# Altium schematic symbol library jlcpcb_2025_04_capacitors_extended_0805.schlib: 3281 symbols (part 17 of 18) (continued)
## TCC0805X7R105K500DTS
designator C?  Capacitance: 1uF  (hidden comment: *)
Capacitor, Ceramic (MLCC), 1uF, ±10%, 50V, X7R, ±10%, SMD 0805; Manufacturer: CCTC; Manufacturer Part Number: TCC0805X7R105K500DTS; Package Size: 0805; JLCPCB Basic Part: No; JLCPCB Part Number: C344178; Supplier 1: LCSC; Category: Capacitors - MLCC; Supplier Part Number 1: C344178; Tolerance: ±10%; Voltage Rating: 50V; Temperature Coefficient: X7R; RoHS: Yes; ComponentLink1Description: Datasheet; ComponentLink1URL: https://wmsc.lcsc.com/wmsc/upload/file/pdf/v2/lcsc/2304140030_CCTC-TCC0805X7R105K500DTS_C344178.pdf; ComponentLink2Description: JLCPCB Part URL; ComponentLink2URL: https://jlcpcb.com/partdetail/C344178; ComponentLink3Description: LCSC Part URL; ComponentLink3URL: https://lcsc.com/product-detail/Multilayer-Ceramic-Capacitors-MLCC---SMD-SMT_CCTC-CCTC-TCC0805X7R105K500DTS_C344178.html
footprint CAP-0805 (0805 (2012M) Capacitor)
pins: 1, 2

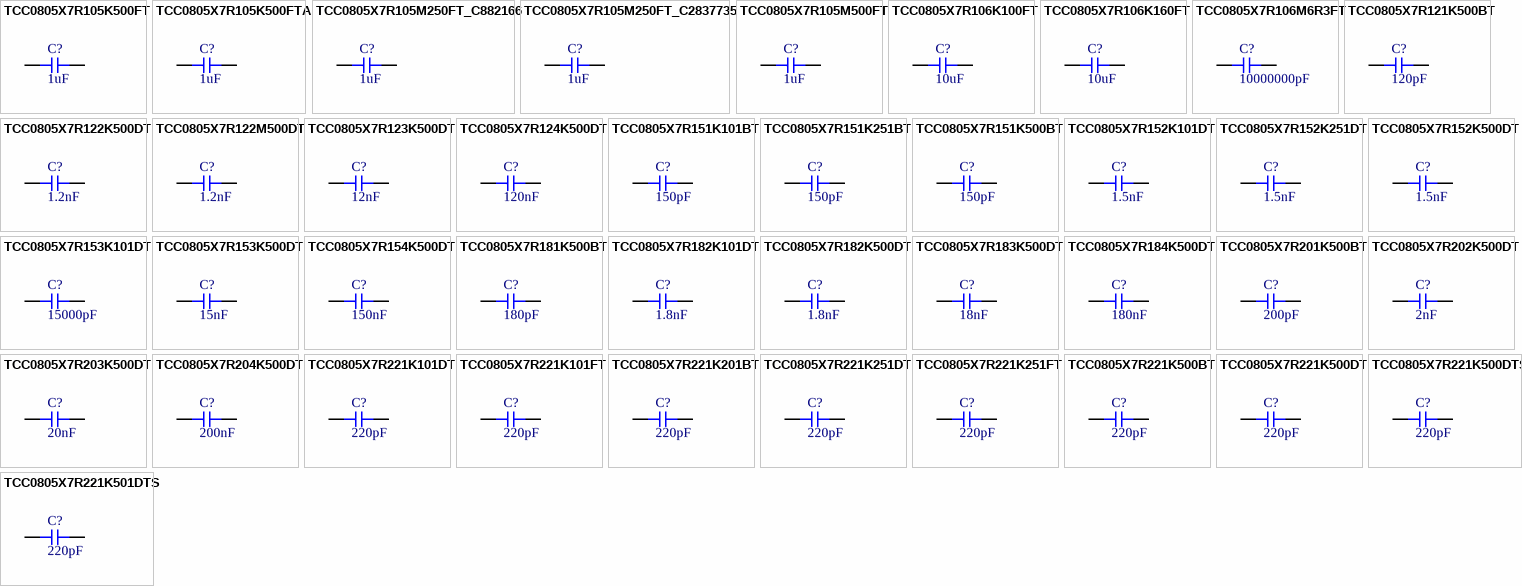
[diagram p77: symbols TCC0805X7R105K500FT to TCC0805X7R221K501DTS]

## TCC0805X7R105K500FT
designator C?  Capacitance: 1uF  (hidden comment: *)
Capacitor, Ceramic (MLCC), 1uF, ±10%, 50V, X7R, ±10%, SMD 0805; Manufacturer: CCTC; Manufacturer Part Number: TCC0805X7R105K500FT; Package Size: 0805; JLCPCB Basic Part: No; JLCPCB Part Number: C376927; Supplier 1: LCSC; Category: Capacitors - MLCC; Supplier Part Number 1: C376927; Tolerance: ±10%; Voltage Rating: 50V; Temperature Coefficient: X7R; RoHS: Yes; ComponentLink1Description: Datasheet; ComponentLink1URL: https://wmsc.lcsc.com/wmsc/upload/file/pdf/v2/lcsc/2304140030_CCTC-TCC0805X7R105K500FT_C376927.pdf; ComponentLink2Description: JLCPCB Part URL; ComponentLink2URL: https://jlcpcb.com/partdetail/C376927; ComponentLink3Description: LCSC Part URL; ComponentLink3URL: https://lcsc.com/product-detail/Multilayer-Ceramic-Capacitors-MLCC---SMD-SMT_CCTC-CCTC-TCC0805X7R105K500FT_C376927.html
footprint CAP-0805 (0805 (2012M) Capacitor)
pins: 1, 2

## TCC0805X7R105K500FTA
designator C?  Capacitance: 1uF  (hidden comment: *)
Capacitor, Ceramic (MLCC), 1uF, ±10%, 50V, X7R, ±10%, SMD 0805; Manufacturer: CCTC; Manufacturer Part Number: TCC0805X7R105K500FTA; Package Size: 0805; JLCPCB Basic Part: No; JLCPCB Part Number: C282737; Supplier 1: LCSC; Category: Capacitors - MLCC; Supplier Part Number 1: C282737; Tolerance: ±10%; Voltage Rating: 50V; Temperature Coefficient: X7R; RoHS: Yes; ComponentLink1Description: Datasheet; ComponentLink1URL: https://wmsc.lcsc.com/wmsc/upload/file/pdf/v2/lcsc/2304140030_CCTC-TCC0805X7R105K500FTA_C282737.pdf; ComponentLink2Description: JLCPCB Part URL; ComponentLink2URL: https://jlcpcb.com/partdetail/C282737; ComponentLink3Description: LCSC Part URL; ComponentLink3URL: https://lcsc.com/product-detail/Multilayer-Ceramic-Capacitors-MLCC---SMD-SMT_CCTC-CCTC-TCC0805X7R105K500FTA_C282737.html
footprint CAP-0805 (0805 (2012M) Capacitor)
pins: 1, 2

## TCC0805X7R105M250FT_C882166
designator C?  Capacitance: 1uF  (hidden comment: *)
Capacitor, Ceramic (MLCC), 1uF, ±20%, 25V, X7R, ±20%, SMD 0805; Manufacturer: CCTC; Manufacturer Part Number: TCC0805X7R105M250FT; Package Size: 0805; JLCPCB Basic Part: No; JLCPCB Part Number: C882166; Supplier 1: LCSC; Category: Capacitors - MLCC; Supplier Part Number 1: C882166; Tolerance: ±20%; Voltage Rating: 25V; Temperature Coefficient: X7R; RoHS: Yes; ComponentLink1Description: Datasheet; ComponentLink1URL: https://wmsc.lcsc.com/wmsc/upload/file/pdf/v2/lcsc/2304140030_CCTC-TCC0805X7R105M250FT_C882166.pdf; ComponentLink2Description: JLCPCB Part URL; ComponentLink2URL: https://jlcpcb.com/partdetail/C882166; ComponentLink3Description: LCSC Part URL; ComponentLink3URL: https://lcsc.com/product-detail/Multilayer-Ceramic-Capacitors-MLCC---SMD-SMT_CCTC-CCTC-TCC0805X7R105M250FT_C882166.html
footprint CAP-0805 (0805 (2012M) Capacitor)
pins: 1, 2

## TCC0805X7R105M250FT_C2837735
designator C?  Capacitance: 1uF  (hidden comment: *)
Capacitor, Ceramic (MLCC), 1uF, ±20%, 25V, X7R, ±20%, SMD 0805; Manufacturer: CCTC; Manufacturer Part Number: TCC0805X7R105M250FT; Package Size: 0805; JLCPCB Basic Part: No; JLCPCB Part Number: C2837735; Supplier 1: LCSC; Category: Capacitors - MLCC; Supplier Part Number 1: C2837735; Tolerance: ±20%; Voltage Rating: 25V; Temperature Coefficient: X7R; RoHS: Yes; ComponentLink1Description: Datasheet; ComponentLink1URL: https://wmsc.lcsc.com/wmsc/upload/file/pdf/v2/lcsc/2106021033_CCTC-TCC0805X7R105M250FT_C2837735.pdf; ComponentLink2Description: JLCPCB Part URL; ComponentLink2URL: https://jlcpcb.com/partdetail/C2837735; ComponentLink3Description: LCSC Part URL; ComponentLink3URL: https://lcsc.com/product-detail/Multilayer-Ceramic-Capacitors-MLCC---SMD-SMT_CCTC-CCTC-TCC0805X7R105M250FT_C2837735.html
footprint CAP-0805 (0805 (2012M) Capacitor)
pins: 1, 2

## TCC0805X7R105M500FT
designator C?  Capacitance: 1uF  (hidden comment: *)
Capacitor, Ceramic (MLCC), 1uF, ±20%, 50V, X7R, ±20%, SMD 0805; Manufacturer: CCTC; Manufacturer Part Number: TCC0805X7R105M500FT; Package Size: 0805; JLCPCB Basic Part: No; JLCPCB Part Number: C376929; Supplier 1: LCSC; Category: Capacitors - MLCC; Supplier Part Number 1: C376929; Tolerance: ±20%; Voltage Rating: 50V; Temperature Coefficient: X7R; RoHS: Yes; ComponentLink1Description: Datasheet; ComponentLink1URL: https://wmsc.lcsc.com/wmsc/upload/file/pdf/v2/lcsc/2304140030_CCTC-TCC0805X7R105M500FT_C376929.pdf; ComponentLink2Description: JLCPCB Part URL; ComponentLink2URL: https://jlcpcb.com/partdetail/C376929; ComponentLink3Description: LCSC Part URL; ComponentLink3URL: https://lcsc.com/product-detail/Multilayer-Ceramic-Capacitors-MLCC---SMD-SMT_CCTC-CCTC-TCC0805X7R105M500FT_C376929.html
footprint CAP-0805 (0805 (2012M) Capacitor)
pins: 1, 2

## TCC0805X7R106K100FT
designator C?  Capacitance: 10uF  (hidden comment: *)
Capacitor, Ceramic (MLCC), 10uF, ±10%, 10V, X7R, ±10%, SMD 0805; Manufacturer: CCTC; Manufacturer Part Number: TCC0805X7R106K100FT; Package Size: 0805; JLCPCB Basic Part: No; JLCPCB Part Number: C380346; Supplier 1: LCSC; Category: Capacitors - MLCC; Supplier Part Number 1: C380346; Tolerance: ±10%; Voltage Rating: 10V; Temperature Coefficient: X7R; RoHS: Yes; ComponentLink1Description: Datasheet; ComponentLink1URL: https://wmsc.lcsc.com/wmsc/upload/file/pdf/v2/lcsc/2304140030_CCTC-TCC0805X7R106K100FT_C380346.pdf; ComponentLink2Description: JLCPCB Part URL; ComponentLink2URL: https://jlcpcb.com/partdetail/C380346; ComponentLink3Description: LCSC Part URL; ComponentLink3URL: https://lcsc.com/product-detail/Multilayer-Ceramic-Capacitors-MLCC---SMD-SMT_CCTC-CCTC-TCC0805X7R106K100FT_C380346.html
footprint CAP-0805 (0805 (2012M) Capacitor)
pins: 1, 2

## TCC0805X7R106K160FT
designator C?  Capacitance: 10uF  (hidden comment: *)
Capacitor, Ceramic (MLCC), 10uF, ±10%, 16V, X7R, ±10%, SMD 0805; Manufacturer: CCTC; Manufacturer Part Number: TCC0805X7R106K160FT; Package Size: 0805; JLCPCB Basic Part: No; JLCPCB Part Number: C380347; Supplier 1: LCSC; Category: Capacitors - MLCC; Supplier Part Number 1: C380347; Tolerance: ±10%; Voltage Rating: 16V; Temperature Coefficient: X7R; RoHS: Yes; ComponentLink1Description: Datasheet; ComponentLink1URL: https://wmsc.lcsc.com/wmsc/upload/file/pdf/v2/lcsc/2304140030_CCTC-TCC0805X7R106K160FT_C380347.pdf; ComponentLink2Description: JLCPCB Part URL; ComponentLink2URL: https://jlcpcb.com/partdetail/C380347; ComponentLink3Description: LCSC Part URL; ComponentLink3URL: https://lcsc.com/product-detail/Multilayer-Ceramic-Capacitors-MLCC---SMD-SMT_CCTC-CCTC-TCC0805X7R106K160FT_C380347.html
footprint CAP-0805 (0805 (2012M) Capacitor)
pins: 1, 2

## TCC0805X7R106M6R3FT
designator C?  Capacitance: 10000000pF  (hidden comment: *)
Capacitor, Ceramic (MLCC), 10000000pF, ±20%, 6.3V, X7R, ±20%, SMD 0805; Manufacturer: CCTC; Manufacturer Part Number: TCC0805X7R106M6R3FT; Package Size: 0805; JLCPCB Basic Part: No; JLCPCB Part Number: C880610; Supplier 1: LCSC; Category: Capacitors - MLCC; Supplier Part Number 1: C880610; Tolerance: ±20%; Voltage Rating: 6.3V; Temperature Coefficient: X7R; RoHS: Yes; ComponentLink1Description: Datasheet; ComponentLink1URL: https://wmsc.lcsc.com/wmsc/upload/file/pdf/v2/lcsc/2304140030_CCTC-TCC0805X7R106M6R3FT_C880610.pdf; ComponentLink2Description: JLCPCB Part URL; ComponentLink2URL: https://jlcpcb.com/partdetail/C880610; ComponentLink3Description: LCSC Part URL; ComponentLink3URL: https://lcsc.com/product-detail/Multilayer-Ceramic-Capacitors-MLCC---SMD-SMT_CCTC-CCTC-TCC0805X7R106M6R3FT_C880610.html
footprint CAP-0805 (0805 (2012M) Capacitor)
pins: 1, 2

## TCC0805X7R121K500BT
designator C?  Capacitance: 120pF  (hidden comment: *)
Capacitor, Ceramic (MLCC), 120pF, ±10%, 50V, X7R, ±10%, SMD 0805; Manufacturer: CCTC; Manufacturer Part Number: TCC0805X7R121K500BT; Package Size: 0805; JLCPCB Basic Part: No; JLCPCB Part Number: C376930; Supplier 1: LCSC; Category: Capacitors - MLCC; Supplier Part Number 1: C376930; Tolerance: ±10%; Voltage Rating: 50V; Temperature Coefficient: X7R; RoHS: Yes; ComponentLink1Description: Datasheet; ComponentLink1URL: https://wmsc.lcsc.com/wmsc/upload/file/pdf/v2/lcsc/2304140030_CCTC-TCC0805X7R121K500BT_C376930.pdf; ComponentLink2Description: JLCPCB Part URL; ComponentLink2URL: https://jlcpcb.com/partdetail/C376930; ComponentLink3Description: LCSC Part URL; ComponentLink3URL: https://lcsc.com/product-detail/Multilayer-Ceramic-Capacitors-MLCC---SMD-SMT_CCTC-CCTC-TCC0805X7R121K500BT_C376930.html
footprint CAP-0805 (0805 (2012M) Capacitor)
pins: 1, 2

## TCC0805X7R122K500DT
designator C?  Capacitance: 1.2nF  (hidden comment: *)
Capacitor, Ceramic (MLCC), 1.2nF, ±10%, 50V, X7R, ±10%, SMD 0805; Manufacturer: CCTC; Manufacturer Part Number: TCC0805X7R122K500DT; Package Size: 0805; JLCPCB Basic Part: No; JLCPCB Part Number: C282740; Supplier 1: LCSC; Category: Capacitors - MLCC; Supplier Part Number 1: C282740; Tolerance: ±10%; Voltage Rating: 50V; Temperature Coefficient: X7R; RoHS: Yes; ComponentLink1Description: Datasheet; ComponentLink1URL: https://wmsc.lcsc.com/wmsc/upload/file/pdf/v2/lcsc/2304140030_CCTC-TCC0805X7R122K500DT_C282740.pdf; ComponentLink2Description: JLCPCB Part URL; ComponentLink2URL: https://jlcpcb.com/partdetail/C282740; ComponentLink3Description: LCSC Part URL; ComponentLink3URL: https://lcsc.com/product-detail/Multilayer-Ceramic-Capacitors-MLCC---SMD-SMT_CCTC-CCTC-TCC0805X7R122K500DT_C282740.html
footprint CAP-0805 (0805 (2012M) Capacitor)
pins: 1, 2

## TCC0805X7R122M500DT
designator C?  Capacitance: 1.2nF  (hidden comment: *)
Capacitor, Ceramic (MLCC), 1.2nF, 50V, SMD 0805; Manufacturer: CCTC; Manufacturer Part Number: TCC0805X7R122M500DT; Package Size: 0805; JLCPCB Basic Part: No; JLCPCB Part Number: C2760545; Supplier 1: LCSC; Category: Capacitors - MLCC; Supplier Part Number 1: C2760545; Voltage Rating: 50V; RoHS: Yes; ComponentLink1Description: Datasheet; ComponentLink1URL: https://wmsc.lcsc.com/wmsc/upload/file/pdf/v2/lcsc/2304140030_CCTC-TCC0805X7R122M500DT_C2760545.pdf; ComponentLink2Description: JLCPCB Part URL; ComponentLink2URL: https://jlcpcb.com/partdetail/C2760545; ComponentLink3Description: LCSC Part URL; ComponentLink3URL: https://lcsc.com/product-detail/Multilayer-Ceramic-Capacitors-MLCC---SMD-SMT_CCTC-CCTC-TCC0805X7R122M500DT_C2760545.html
footprint CAP-0805 (0805 (2012M) Capacitor)
pins: 1, 2

## TCC0805X7R123K500DT
designator C?  Capacitance: 12nF  (hidden comment: *)
Capacitor, Ceramic (MLCC), 12nF, ±10%, 50V, X7R, ±10%, SMD 0805; Manufacturer: CCTC; Manufacturer Part Number: TCC0805X7R123K500DT; Package Size: 0805; JLCPCB Basic Part: No; JLCPCB Part Number: C309047; Supplier 1: LCSC; Category: Capacitors - MLCC; Supplier Part Number 1: C309047; Tolerance: ±10%; Voltage Rating: 50V; Temperature Coefficient: X7R; RoHS: Yes; ComponentLink1Description: Datasheet; ComponentLink1URL: https://wmsc.lcsc.com/wmsc/upload/file/pdf/v2/lcsc/2304140030_CCTC-TCC0805X7R123K500DT_C309047.pdf; ComponentLink2Description: JLCPCB Part URL; ComponentLink2URL: https://jlcpcb.com/partdetail/C309047; ComponentLink3Description: LCSC Part URL; ComponentLink3URL: https://lcsc.com/product-detail/Multilayer-Ceramic-Capacitors-MLCC---SMD-SMT_CCTC-CCTC-TCC0805X7R123K500DT_C309047.html
footprint CAP-0805 (0805 (2012M) Capacitor)
pins: 1, 2

## TCC0805X7R124K500DT
designator C?  Capacitance: 120nF  (hidden comment: *)
Capacitor, Ceramic (MLCC), 120nF, ±10%, 50V, X7R, ±10%, SMD 0805; Manufacturer: CCTC; Manufacturer Part Number: TCC0805X7R124K500DT; Package Size: 0805; JLCPCB Basic Part: No; JLCPCB Part Number: C376931; Supplier 1: LCSC; Category: Capacitors - MLCC; Supplier Part Number 1: C376931; Tolerance: ±10%; Voltage Rating: 50V; Temperature Coefficient: X7R; RoHS: Yes; ComponentLink1Description: Datasheet; ComponentLink1URL: https://wmsc.lcsc.com/wmsc/upload/file/pdf/v2/lcsc/2304140030_CCTC-TCC0805X7R124K500DT_C376931.pdf; ComponentLink2Description: JLCPCB Part URL; ComponentLink2URL: https://jlcpcb.com/partdetail/C376931; ComponentLink3Description: LCSC Part URL; ComponentLink3URL: https://lcsc.com/product-detail/Multilayer-Ceramic-Capacitors-MLCC---SMD-SMT_CCTC-CCTC-TCC0805X7R124K500DT_C376931.html
footprint CAP-0805 (0805 (2012M) Capacitor)
pins: 1, 2

## TCC0805X7R151K101BT
designator C?  Capacitance: 150pF  (hidden comment: *)
Capacitor, Ceramic (MLCC), 150pF, ±10%, 100V, X7R, ±10%, SMD 0805; Manufacturer: CCTC; Manufacturer Part Number: TCC0805X7R151K101BT; Package Size: 0805; JLCPCB Basic Part: No; JLCPCB Part Number: C282741; Supplier 1: LCSC; Category: Capacitors - MLCC; Supplier Part Number 1: C282741; Tolerance: ±10%; Voltage Rating: 100V; Temperature Coefficient: X7R; RoHS: Yes; ComponentLink1Description: Datasheet; ComponentLink1URL: https://wmsc.lcsc.com/wmsc/upload/file/pdf/v2/lcsc/2304140030_CCTC-TCC0805X7R151K101BT_C282741.pdf; ComponentLink2Description: JLCPCB Part URL; ComponentLink2URL: https://jlcpcb.com/partdetail/C282741; ComponentLink3Description: LCSC Part URL; ComponentLink3URL: https://lcsc.com/product-detail/Multilayer-Ceramic-Capacitors-MLCC---SMD-SMT_CCTC-CCTC-TCC0805X7R151K101BT_C282741.html
footprint CAP-0805 (0805 (2012M) Capacitor)
pins: 1, 2

## TCC0805X7R151K251BT
designator C?  Capacitance: 150pF  (hidden comment: *)
Capacitor, Ceramic (MLCC), 150pF, ±10%, 250V, X7R, ±10%, SMD 0805; Manufacturer: CCTC; Manufacturer Part Number: TCC0805X7R151K251BT; Package Size: 0805; JLCPCB Basic Part: No; JLCPCB Part Number: C282742; Supplier 1: LCSC; Category: Capacitors - MLCC; Supplier Part Number 1: C282742; Tolerance: ±10%; Voltage Rating: 250V; Temperature Coefficient: X7R; RoHS: Yes; ComponentLink1Description: Datasheet; ComponentLink1URL: https://wmsc.lcsc.com/wmsc/upload/file/pdf/v2/lcsc/2304140030_CCTC-TCC0805X7R151K251BT_C282742.pdf; ComponentLink2Description: JLCPCB Part URL; ComponentLink2URL: https://jlcpcb.com/partdetail/C282742; ComponentLink3Description: LCSC Part URL; ComponentLink3URL: https://lcsc.com/product-detail/Multilayer-Ceramic-Capacitors-MLCC---SMD-SMT_CCTC-CCTC-TCC0805X7R151K251BT_C282742.html
footprint CAP-0805 (0805 (2012M) Capacitor)
pins: 1, 2

## TCC0805X7R151K500BT
designator C?  Capacitance: 150pF  (hidden comment: *)
Capacitor, Ceramic (MLCC), 150pF, ±10%, 50V, X7R, ±10%, SMD 0805; Manufacturer: CCTC; Manufacturer Part Number: TCC0805X7R151K500BT; Package Size: 0805; JLCPCB Basic Part: No; JLCPCB Part Number: C282743; Supplier 1: LCSC; Category: Capacitors - MLCC; Supplier Part Number 1: C282743; Tolerance: ±10%; Voltage Rating: 50V; Temperature Coefficient: X7R; RoHS: Yes; ComponentLink1Description: Datasheet; ComponentLink1URL: https://wmsc.lcsc.com/wmsc/upload/file/pdf/v2/lcsc/2304140030_CCTC-TCC0805X7R151K500BT_C282743.pdf; ComponentLink2Description: JLCPCB Part URL; ComponentLink2URL: https://jlcpcb.com/partdetail/C282743; ComponentLink3Description: LCSC Part URL; ComponentLink3URL: https://lcsc.com/product-detail/Multilayer-Ceramic-Capacitors-MLCC---SMD-SMT_CCTC-CCTC-TCC0805X7R151K500BT_C282743.html
footprint CAP-0805 (0805 (2012M) Capacitor)
pins: 1, 2

## TCC0805X7R152K101DT
designator C?  Capacitance: 1.5nF  (hidden comment: *)
Capacitor, Ceramic (MLCC), 1.5nF, ±10%, 100V, X7R, ±10%, SMD 0805; Manufacturer: CCTC; Manufacturer Part Number: TCC0805X7R152K101DT; Package Size: 0805; JLCPCB Basic Part: No; JLCPCB Part Number: C376932; Supplier 1: LCSC; Category: Capacitors - MLCC; Supplier Part Number 1: C376932; Tolerance: ±10%; Voltage Rating: 100V; Temperature Coefficient: X7R; RoHS: Yes; ComponentLink1Description: Datasheet; ComponentLink1URL: https://wmsc.lcsc.com/wmsc/upload/file/pdf/v2/lcsc/2304140030_CCTC-TCC0805X7R152K101DT_C376932.pdf; ComponentLink2Description: JLCPCB Part URL; ComponentLink2URL: https://jlcpcb.com/partdetail/C376932; ComponentLink3Description: LCSC Part URL; ComponentLink3URL: https://lcsc.com/product-detail/Multilayer-Ceramic-Capacitors-MLCC---SMD-SMT_CCTC-CCTC-TCC0805X7R152K101DT_C376932.html
footprint CAP-0805 (0805 (2012M) Capacitor)
pins: 1, 2

## TCC0805X7R152K251DT
designator C?  Capacitance: 1.5nF  (hidden comment: *)
Capacitor, Ceramic (MLCC), 1.5nF, ±10%, 250V, X7R, ±10%, SMD 0805; Manufacturer: CCTC; Manufacturer Part Number: TCC0805X7R152K251DT; Package Size: 0805; JLCPCB Basic Part: No; JLCPCB Part Number: C282744; Supplier 1: LCSC; Category: Capacitors - MLCC; Supplier Part Number 1: C282744; Tolerance: ±10%; Voltage Rating: 250V; Temperature Coefficient: X7R; RoHS: Yes; ComponentLink1Description: Datasheet; ComponentLink1URL: https://wmsc.lcsc.com/wmsc/upload/file/pdf/v2/lcsc/2304140030_CCTC-TCC0805X7R152K251DT_C282744.pdf; ComponentLink2Description: JLCPCB Part URL; ComponentLink2URL: https://jlcpcb.com/partdetail/C282744; ComponentLink3Description: LCSC Part URL; ComponentLink3URL: https://lcsc.com/product-detail/Multilayer-Ceramic-Capacitors-MLCC---SMD-SMT_CCTC-CCTC-TCC0805X7R152K251DT_C282744.html
footprint CAP-0805 (0805 (2012M) Capacitor)
pins: 1, 2

## TCC0805X7R152K500DT
designator C?  Capacitance: 1.5nF  (hidden comment: *)
Capacitor, Ceramic (MLCC), 1.5nF, ±10%, 50V, X7R, ±10%, SMD 0805; Manufacturer: CCTC; Manufacturer Part Number: TCC0805X7R152K500DT; Package Size: 0805; JLCPCB Basic Part: No; JLCPCB Part Number: C282745; Supplier 1: LCSC; Category: Capacitors - MLCC; Supplier Part Number 1: C282745; Tolerance: ±10%; Voltage Rating: 50V; Temperature Coefficient: X7R; RoHS: Yes; ComponentLink1Description: Datasheet; ComponentLink1URL: https://wmsc.lcsc.com/wmsc/upload/file/pdf/v2/lcsc/2304140030_CCTC-TCC0805X7R152K500DT_C282745.pdf; ComponentLink2Description: JLCPCB Part URL; ComponentLink2URL: https://jlcpcb.com/partdetail/C282745; ComponentLink3Description: LCSC Part URL; ComponentLink3URL: https://lcsc.com/product-detail/Multilayer-Ceramic-Capacitors-MLCC---SMD-SMT_CCTC-CCTC-TCC0805X7R152K500DT_C282745.html
footprint CAP-0805 (0805 (2012M) Capacitor)
pins: 1, 2

## TCC0805X7R153K101DT
designator C?  Capacitance: 15000pF  (hidden comment: *)
Capacitor, Ceramic (MLCC), 15000pF, ±10%, 100V, X7R, ±10%, SMD 0805; Manufacturer: CCTC; Manufacturer Part Number: TCC0805X7R153K101DT; Package Size: 0805; JLCPCB Basic Part: No; JLCPCB Part Number: C880625; Supplier 1: LCSC; Category: Capacitors - MLCC; Supplier Part Number 1: C880625; Tolerance: ±10%; Voltage Rating: 100V; Temperature Coefficient: X7R; RoHS: Yes; ComponentLink1Description: Datasheet; ComponentLink1URL: https://wmsc.lcsc.com/wmsc/upload/file/pdf/v2/lcsc/2304140030_CCTC-TCC0805X7R153K101DT_C880625.pdf; ComponentLink2Description: JLCPCB Part URL; ComponentLink2URL: https://jlcpcb.com/partdetail/C880625; ComponentLink3Description: LCSC Part URL; ComponentLink3URL: https://lcsc.com/product-detail/Multilayer-Ceramic-Capacitors-MLCC---SMD-SMT_CCTC-CCTC-TCC0805X7R153K101DT_C880625.html
footprint CAP-0805 (0805 (2012M) Capacitor)
pins: 1, 2

## TCC0805X7R153K500DT
designator C?  Capacitance: 15nF  (hidden comment: *)
Capacitor, Ceramic (MLCC), 15nF, ±10%, 50V, X7R, ±10%, SMD 0805; Manufacturer: CCTC; Manufacturer Part Number: TCC0805X7R153K500DT; Package Size: 0805; JLCPCB Basic Part: No; JLCPCB Part Number: C282747; Supplier 1: LCSC; Category: Capacitors - MLCC; Supplier Part Number 1: C282747; Tolerance: ±10%; Voltage Rating: 50V; Temperature Coefficient: X7R; RoHS: Yes; ComponentLink1Description: Datasheet; ComponentLink1URL: https://wmsc.lcsc.com/wmsc/upload/file/pdf/v2/lcsc/2304140030_CCTC-TCC0805X7R153K500DT_C282747.pdf; ComponentLink2Description: JLCPCB Part URL; ComponentLink2URL: https://jlcpcb.com/partdetail/C282747; ComponentLink3Description: LCSC Part URL; ComponentLink3URL: https://lcsc.com/product-detail/Multilayer-Ceramic-Capacitors-MLCC---SMD-SMT_CCTC-CCTC-TCC0805X7R153K500DT_C282747.html
footprint CAP-0805 (0805 (2012M) Capacitor)
pins: 1, 2

## TCC0805X7R154K500DT
designator C?  Capacitance: 150nF  (hidden comment: *)
Capacitor, Ceramic (MLCC), 150nF, ±10%, 50V, X7R, ±10%, SMD 0805; Manufacturer: CCTC; Manufacturer Part Number: TCC0805X7R154K500DT; Package Size: 0805; JLCPCB Basic Part: No; JLCPCB Part Number: C376934; Supplier 1: LCSC; Category: Capacitors - MLCC; Supplier Part Number 1: C376934; Tolerance: ±10%; Voltage Rating: 50V; Temperature Coefficient: X7R; RoHS: Yes; ComponentLink1Description: Datasheet; ComponentLink1URL: https://wmsc.lcsc.com/wmsc/upload/file/pdf/v2/lcsc/2304140030_CCTC-TCC0805X7R154K500DT_C376934.pdf; ComponentLink2Description: JLCPCB Part URL; ComponentLink2URL: https://jlcpcb.com/partdetail/C376934; ComponentLink3Description: LCSC Part URL; ComponentLink3URL: https://lcsc.com/product-detail/Multilayer-Ceramic-Capacitors-MLCC---SMD-SMT_CCTC-CCTC-TCC0805X7R154K500DT_C376934.html
footprint CAP-0805 (0805 (2012M) Capacitor)
pins: 1, 2

## TCC0805X7R181K500BT
designator C?  Capacitance: 180pF  (hidden comment: *)
Capacitor, Ceramic (MLCC), 180pF, ±10%, 50V, X7R, ±10%, SMD 0805; Manufacturer: CCTC; Manufacturer Part Number: TCC0805X7R181K500BT; Package Size: 0805; JLCPCB Basic Part: No; JLCPCB Part Number: C376935; Supplier 1: LCSC; Category: Capacitors - MLCC; Supplier Part Number 1: C376935; Tolerance: ±10%; Voltage Rating: 50V; Temperature Coefficient: X7R; RoHS: Yes; ComponentLink1Description: Datasheet; ComponentLink1URL: https://wmsc.lcsc.com/wmsc/upload/file/pdf/v2/lcsc/2304140030_CCTC-TCC0805X7R181K500BT_C376935.pdf; ComponentLink2Description: JLCPCB Part URL; ComponentLink2URL: https://jlcpcb.com/partdetail/C376935; ComponentLink3Description: LCSC Part URL; ComponentLink3URL: https://lcsc.com/product-detail/Multilayer-Ceramic-Capacitors-MLCC---SMD-SMT_CCTC-CCTC-TCC0805X7R181K500BT_C376935.html
footprint CAP-0805 (0805 (2012M) Capacitor)
pins: 1, 2

## TCC0805X7R182K101DT
designator C?  Capacitance: 1.8nF  (hidden comment: *)
Capacitor, Ceramic (MLCC), 1.8nF, ±10%, 100V, X7R, ±10%, SMD 0805; Manufacturer: CCTC; Manufacturer Part Number: TCC0805X7R182K101DT; Package Size: 0805; JLCPCB Basic Part: No; JLCPCB Part Number: C696871; Supplier 1: LCSC; Category: Capacitors - MLCC; Supplier Part Number 1: C696871; Tolerance: ±10%; Voltage Rating: 100V; Temperature Coefficient: X7R; RoHS: Yes; ComponentLink1Description: Datasheet; ComponentLink1URL: https://wmsc.lcsc.com/wmsc/upload/file/pdf/v2/lcsc/2304140030_CCTC-TCC0805X7R182K101DT_C696871.pdf; ComponentLink2Description: JLCPCB Part URL; ComponentLink2URL: https://jlcpcb.com/partdetail/C696871; ComponentLink3Description: LCSC Part URL; ComponentLink3URL: https://lcsc.com/product-detail/Multilayer-Ceramic-Capacitors-MLCC---SMD-SMT_CCTC-CCTC-TCC0805X7R182K101DT_C696871.html
footprint CAP-0805 (0805 (2012M) Capacitor)
pins: 1, 2

## TCC0805X7R182K500DT
designator C?  Capacitance: 1.8nF  (hidden comment: *)
Capacitor, Ceramic (MLCC), 1.8nF, ±10%, 50V, X7R, ±10%, SMD 0805; Manufacturer: CCTC; Manufacturer Part Number: TCC0805X7R182K500DT; Package Size: 0805; JLCPCB Basic Part: No; JLCPCB Part Number: C376936; Supplier 1: LCSC; Category: Capacitors - MLCC; Supplier Part Number 1: C376936; Tolerance: ±10%; Voltage Rating: 50V; Temperature Coefficient: X7R; RoHS: Yes; ComponentLink1Description: Datasheet; ComponentLink1URL: https://wmsc.lcsc.com/wmsc/upload/file/pdf/v2/lcsc/2304140030_CCTC-TCC0805X7R182K500DT_C376936.pdf; ComponentLink2Description: JLCPCB Part URL; ComponentLink2URL: https://jlcpcb.com/partdetail/C376936; ComponentLink3Description: LCSC Part URL; ComponentLink3URL: https://lcsc.com/product-detail/Multilayer-Ceramic-Capacitors-MLCC---SMD-SMT_CCTC-CCTC-TCC0805X7R182K500DT_C376936.html
footprint CAP-0805 (0805 (2012M) Capacitor)
pins: 1, 2

## TCC0805X7R183K500DT
designator C?  Capacitance: 18nF  (hidden comment: *)
Capacitor, Ceramic (MLCC), 18nF, ±10%, 50V, X7R, ±10%, SMD 0805; Manufacturer: CCTC; Manufacturer Part Number: TCC0805X7R183K500DT; Package Size: 0805; JLCPCB Basic Part: No; JLCPCB Part Number: C376937; Supplier 1: LCSC; Category: Capacitors - MLCC; Supplier Part Number 1: C376937; Tolerance: ±10%; Voltage Rating: 50V; Temperature Coefficient: X7R; RoHS: Yes; ComponentLink1Description: Datasheet; ComponentLink1URL: https://wmsc.lcsc.com/wmsc/upload/file/pdf/v2/lcsc/2304140030_CCTC-TCC0805X7R183K500DT_C376937.pdf; ComponentLink2Description: JLCPCB Part URL; ComponentLink2URL: https://jlcpcb.com/partdetail/C376937; ComponentLink3Description: LCSC Part URL; ComponentLink3URL: https://lcsc.com/product-detail/Multilayer-Ceramic-Capacitors-MLCC---SMD-SMT_CCTC-CCTC-TCC0805X7R183K500DT_C376937.html
footprint CAP-0805 (0805 (2012M) Capacitor)
pins: 1, 2

## TCC0805X7R184K500DT
designator C?  Capacitance: 180nF  (hidden comment: *)
Capacitor, Ceramic (MLCC), 180nF, ±10%, 50V, X7R, ±10%, SMD 0805; Manufacturer: CCTC; Manufacturer Part Number: TCC0805X7R184K500DT; Package Size: 0805; JLCPCB Basic Part: No; JLCPCB Part Number: C376938; Supplier 1: LCSC; Category: Capacitors - MLCC; Supplier Part Number 1: C376938; Tolerance: ±10%; Voltage Rating: 50V; Temperature Coefficient: X7R; RoHS: Yes; ComponentLink1Description: Datasheet; ComponentLink1URL: https://wmsc.lcsc.com/wmsc/upload/file/pdf/v2/lcsc/2304140030_CCTC-TCC0805X7R184K500DT_C376938.pdf; ComponentLink2Description: JLCPCB Part URL; ComponentLink2URL: https://jlcpcb.com/partdetail/C376938; ComponentLink3Description: LCSC Part URL; ComponentLink3URL: https://lcsc.com/product-detail/Multilayer-Ceramic-Capacitors-MLCC---SMD-SMT_CCTC-CCTC-TCC0805X7R184K500DT_C376938.html
footprint CAP-0805 (0805 (2012M) Capacitor)
pins: 1, 2

## TCC0805X7R201K500BT
designator C?  Capacitance: 200pF  (hidden comment: *)
Capacitor, Ceramic (MLCC), 200pF, ±10%, 50V, X7R, ±10%, SMD 0805; Manufacturer: CCTC; Manufacturer Part Number: TCC0805X7R201K500BT; Package Size: 0805; JLCPCB Basic Part: No; JLCPCB Part Number: C376939; Supplier 1: LCSC; Category: Capacitors - MLCC; Supplier Part Number 1: C376939; Tolerance: ±10%; Voltage Rating: 50V; Temperature Coefficient: X7R; RoHS: Yes; ComponentLink1Description: Datasheet; ComponentLink1URL: https://wmsc.lcsc.com/wmsc/upload/file/pdf/v2/lcsc/2304140030_CCTC-TCC0805X7R201K500BT_C376939.pdf; ComponentLink2Description: JLCPCB Part URL; ComponentLink2URL: https://jlcpcb.com/partdetail/C376939; ComponentLink3Description: LCSC Part URL; ComponentLink3URL: https://lcsc.com/product-detail/Multilayer-Ceramic-Capacitors-MLCC---SMD-SMT_CCTC-CCTC-TCC0805X7R201K500BT_C376939.html
footprint CAP-0805 (0805 (2012M) Capacitor)
pins: 1, 2

## TCC0805X7R202K500DT
designator C?  Capacitance: 2nF  (hidden comment: *)
Capacitor, Ceramic (MLCC), 2nF, ±10%, 50V, X7R, ±10%, SMD 0805; Manufacturer: CCTC; Manufacturer Part Number: TCC0805X7R202K500DT; Package Size: 0805; JLCPCB Basic Part: No; JLCPCB Part Number: C376940; Supplier 1: LCSC; Category: Capacitors - MLCC; Supplier Part Number 1: C376940; Tolerance: ±10%; Voltage Rating: 50V; Temperature Coefficient: X7R; RoHS: Yes; ComponentLink1Description: Datasheet; ComponentLink1URL: https://wmsc.lcsc.com/wmsc/upload/file/pdf/v2/lcsc/2304140030_CCTC-TCC0805X7R202K500DT_C376940.pdf; ComponentLink2Description: JLCPCB Part URL; ComponentLink2URL: https://jlcpcb.com/partdetail/C376940; ComponentLink3Description: LCSC Part URL; ComponentLink3URL: https://lcsc.com/product-detail/Multilayer-Ceramic-Capacitors-MLCC---SMD-SMT_CCTC-CCTC-TCC0805X7R202K500DT_C376940.html
footprint CAP-0805 (0805 (2012M) Capacitor)
pins: 1, 2

## TCC0805X7R203K500DT
designator C?  Capacitance: 20nF  (hidden comment: *)
Capacitor, Ceramic (MLCC), 20nF, ±10%, 50V, X7R, ±10%, SMD 0805; Manufacturer: CCTC; Manufacturer Part Number: TCC0805X7R203K500DT; Package Size: 0805; JLCPCB Basic Part: No; JLCPCB Part Number: C376941; Supplier 1: LCSC; Category: Capacitors - MLCC; Supplier Part Number 1: C376941; Tolerance: ±10%; Voltage Rating: 50V; Temperature Coefficient: X7R; RoHS: Yes; ComponentLink1Description: Datasheet; ComponentLink1URL: https://wmsc.lcsc.com/wmsc/upload/file/pdf/v2/lcsc/2304140030_CCTC-TCC0805X7R203K500DT_C376941.pdf; ComponentLink2Description: JLCPCB Part URL; ComponentLink2URL: https://jlcpcb.com/partdetail/C376941; ComponentLink3Description: LCSC Part URL; ComponentLink3URL: https://lcsc.com/product-detail/Multilayer-Ceramic-Capacitors-MLCC---SMD-SMT_CCTC-CCTC-TCC0805X7R203K500DT_C376941.html
footprint CAP-0805 (0805 (2012M) Capacitor)
pins: 1, 2

## TCC0805X7R204K500DT
designator C?  Capacitance: 200nF  (hidden comment: *)
Capacitor, Ceramic (MLCC), 200nF, ±10%, 50V, X7R, ±10%, SMD 0805; Manufacturer: CCTC; Manufacturer Part Number: TCC0805X7R204K500DT; Package Size: 0805; JLCPCB Basic Part: No; JLCPCB Part Number: C344170; Supplier 1: LCSC; Category: Capacitors - MLCC; Supplier Part Number 1: C344170; Tolerance: ±10%; Voltage Rating: 50V; Temperature Coefficient: X7R; RoHS: Yes; ComponentLink1Description: Datasheet; ComponentLink1URL: https://wmsc.lcsc.com/wmsc/upload/file/pdf/v2/lcsc/2304140030_CCTC-TCC0805X7R204K500DT_C344170.pdf; ComponentLink2Description: JLCPCB Part URL; ComponentLink2URL: https://jlcpcb.com/partdetail/C344170; ComponentLink3Description: LCSC Part URL; ComponentLink3URL: https://lcsc.com/product-detail/Multilayer-Ceramic-Capacitors-MLCC---SMD-SMT_CCTC-CCTC-TCC0805X7R204K500DT_C344170.html
footprint CAP-0805 (0805 (2012M) Capacitor)
pins: 1, 2

## TCC0805X7R221K101DT
designator C?  Capacitance: 220pF  (hidden comment: *)
Capacitor, Ceramic (MLCC), 220pF, ±10%, 100V, X7R, ±10%, SMD 0805; Manufacturer: CCTC; Manufacturer Part Number: TCC0805X7R221K101DT; Package Size: 0805; JLCPCB Basic Part: No; JLCPCB Part Number: C880650; Supplier 1: LCSC; Category: Capacitors - MLCC; Supplier Part Number 1: C880650; Tolerance: ±10%; Voltage Rating: 100V; Temperature Coefficient: X7R; RoHS: Yes; ComponentLink1Description: Datasheet; ComponentLink1URL: https://wmsc.lcsc.com/wmsc/upload/file/pdf/v2/lcsc/2304140030_CCTC-TCC0805X7R221K101DT_C880650.pdf; ComponentLink2Description: JLCPCB Part URL; ComponentLink2URL: https://jlcpcb.com/partdetail/C880650; ComponentLink3Description: LCSC Part URL; ComponentLink3URL: https://lcsc.com/product-detail/Multilayer-Ceramic-Capacitors-MLCC---SMD-SMT_CCTC-CCTC-TCC0805X7R221K101DT_C880650.html
footprint CAP-0805 (0805 (2012M) Capacitor)
pins: 1, 2

## TCC0805X7R221K101FT
designator C?  Capacitance: 220pF  (hidden comment: *)
Capacitor, Ceramic (MLCC), 220pF, ±10%, 100V, X7R, ±10%, SMD 0805; Manufacturer: CCTC; Manufacturer Part Number: TCC0805X7R221K101FT; Package Size: 0805; JLCPCB Basic Part: No; JLCPCB Part Number: C376943; Supplier 1: LCSC; Category: Capacitors - MLCC; Supplier Part Number 1: C376943; Tolerance: ±10%; Voltage Rating: 100V; Temperature Coefficient: X7R; RoHS: Yes; ComponentLink1Description: Datasheet; ComponentLink1URL: https://wmsc.lcsc.com/wmsc/upload/file/pdf/v2/lcsc/2304140030_CCTC-TCC0805X7R221K101FT_C376943.pdf; ComponentLink2Description: JLCPCB Part URL; ComponentLink2URL: https://jlcpcb.com/partdetail/C376943; ComponentLink3Description: LCSC Part URL; ComponentLink3URL: https://lcsc.com/product-detail/Multilayer-Ceramic-Capacitors-MLCC---SMD-SMT_CCTC-CCTC-TCC0805X7R221K101FT_C376943.html
footprint CAP-0805 (0805 (2012M) Capacitor)
pins: 1, 2

## TCC0805X7R221K201BT
designator C?  Capacitance: 220pF  (hidden comment: *)
Capacitor, Ceramic (MLCC), 220pF, ±10%, 200V, X7R, ±10%, SMD 0805; Manufacturer: CCTC; Manufacturer Part Number: TCC0805X7R221K201BT; Package Size: 0805; JLCPCB Basic Part: No; JLCPCB Part Number: C376944; Supplier 1: LCSC; Category: Capacitors - MLCC; Supplier Part Number 1: C376944; Tolerance: ±10%; Voltage Rating: 200V; Temperature Coefficient: X7R; RoHS: Yes; ComponentLink1Description: Datasheet; ComponentLink1URL: https://wmsc.lcsc.com/wmsc/upload/file/pdf/v2/lcsc/2304140030_CCTC-TCC0805X7R221K201BT_C376944.pdf; ComponentLink2Description: JLCPCB Part URL; ComponentLink2URL: https://jlcpcb.com/partdetail/C376944; ComponentLink3Description: LCSC Part URL; ComponentLink3URL: https://lcsc.com/product-detail/Multilayer-Ceramic-Capacitors-MLCC---SMD-SMT_CCTC-CCTC-TCC0805X7R221K201BT_C376944.html
footprint CAP-0805 (0805 (2012M) Capacitor)
pins: 1, 2

## TCC0805X7R221K251DT
designator C?  Capacitance: 220pF  (hidden comment: *)
Capacitor, Ceramic (MLCC), 220pF, ±10%, 250V, X7R, ±10%, SMD 0805; Manufacturer: CCTC; Manufacturer Part Number: TCC0805X7R221K251DT; Package Size: 0805; JLCPCB Basic Part: No; JLCPCB Part Number: C696889; Supplier 1: LCSC; Category: Capacitors - MLCC; Supplier Part Number 1: C696889; Tolerance: ±10%; Voltage Rating: 250V; Temperature Coefficient: X7R; RoHS: Yes; ComponentLink1Description: Datasheet; ComponentLink1URL: https://wmsc.lcsc.com/wmsc/upload/file/pdf/v2/lcsc/2304140030_CCTC-TCC0805X7R221K251DT_C696889.pdf; ComponentLink2Description: JLCPCB Part URL; ComponentLink2URL: https://jlcpcb.com/partdetail/C696889; ComponentLink3Description: LCSC Part URL; ComponentLink3URL: https://lcsc.com/product-detail/Multilayer-Ceramic-Capacitors-MLCC---SMD-SMT_CCTC-CCTC-TCC0805X7R221K251DT_C696889.html
footprint CAP-0805 (0805 (2012M) Capacitor)
pins: 1, 2

## TCC0805X7R221K251FT
designator C?  Capacitance: 220pF  (hidden comment: *)
Capacitor, Ceramic (MLCC), 220pF, ±10%, 250V, X7R, ±10%, SMD 0805; Manufacturer: CCTC; Manufacturer Part Number: TCC0805X7R221K251FT; Package Size: 0805; JLCPCB Basic Part: No; JLCPCB Part Number: C376946; Supplier 1: LCSC; Category: Capacitors - MLCC; Supplier Part Number 1: C376946; Tolerance: ±10%; Voltage Rating: 250V; Temperature Coefficient: X7R; RoHS: Yes; ComponentLink1Description: Datasheet; ComponentLink1URL: https://wmsc.lcsc.com/wmsc/upload/file/pdf/v2/lcsc/2304140030_CCTC-TCC0805X7R221K251FT_C376946.pdf; ComponentLink2Description: JLCPCB Part URL; ComponentLink2URL: https://jlcpcb.com/partdetail/C376946; ComponentLink3Description: LCSC Part URL; ComponentLink3URL: https://lcsc.com/product-detail/Multilayer-Ceramic-Capacitors-MLCC---SMD-SMT_CCTC-CCTC-TCC0805X7R221K251FT_C376946.html
footprint CAP-0805 (0805 (2012M) Capacitor)
pins: 1, 2

## TCC0805X7R221K500BT
designator C?  Capacitance: 220pF  (hidden comment: *)
Capacitor, Ceramic (MLCC), 220pF, ±10%, 50V, X7R, ±10%, SMD 0805; Manufacturer: CCTC; Manufacturer Part Number: TCC0805X7R221K500BT; Package Size: 0805; JLCPCB Basic Part: No; JLCPCB Part Number: C376947; Supplier 1: LCSC; Category: Capacitors - MLCC; Supplier Part Number 1: C376947; Tolerance: ±10%; Voltage Rating: 50V; Temperature Coefficient: X7R; RoHS: Yes; ComponentLink1Description: Datasheet; ComponentLink1URL: https://wmsc.lcsc.com/wmsc/upload/file/pdf/v2/lcsc/2304140030_CCTC-TCC0805X7R221K500BT_C376947.pdf; ComponentLink2Description: JLCPCB Part URL; ComponentLink2URL: https://jlcpcb.com/partdetail/C376947; ComponentLink3Description: LCSC Part URL; ComponentLink3URL: https://lcsc.com/product-detail/Multilayer-Ceramic-Capacitors-MLCC---SMD-SMT_CCTC-CCTC-TCC0805X7R221K500BT_C376947.html
footprint CAP-0805 (0805 (2012M) Capacitor)
pins: 1, 2

## TCC0805X7R221K500DT
designator C?  Capacitance: 220pF  (hidden comment: *)
Capacitor, Ceramic (MLCC), 220pF, ±10%, 50V, X7R, ±10%, SMD 0805; Manufacturer: CCTC; Manufacturer Part Number: TCC0805X7R221K500DT; Package Size: 0805; JLCPCB Basic Part: No; JLCPCB Part Number: C344176; Supplier 1: LCSC; Category: Capacitors - MLCC; Supplier Part Number 1: C344176; Tolerance: ±10%; Voltage Rating: 50V; Temperature Coefficient: X7R; RoHS: Yes; ComponentLink1Description: Datasheet; ComponentLink1URL: https://wmsc.lcsc.com/wmsc/upload/file/pdf/v2/lcsc/2304140030_CCTC-TCC0805X7R221K500DT_C344176.pdf; ComponentLink2Description: JLCPCB Part URL; ComponentLink2URL: https://jlcpcb.com/partdetail/C344176; ComponentLink3Description: LCSC Part URL; ComponentLink3URL: https://lcsc.com/product-detail/Multilayer-Ceramic-Capacitors-MLCC---SMD-SMT_CCTC-CCTC-TCC0805X7R221K500DT_C344176.html
footprint CAP-0805 (0805 (2012M) Capacitor)
pins: 1, 2

## TCC0805X7R221K500DTS
designator C?  Capacitance: 220pF  (hidden comment: *)
Capacitor, Ceramic (MLCC), 220pF, ±10%, 50V, X7R, ±10%, SMD 0805; Manufacturer: CCTC; Manufacturer Part Number: TCC0805X7R221K500DTS; Package Size: 0805; JLCPCB Basic Part: No; JLCPCB Part Number: C2932185; Supplier 1: LCSC; Category: Capacitors - MLCC; Supplier Part Number 1: C2932185; Tolerance: ±10%; Voltage Rating: 50V; Temperature Coefficient: X7R; RoHS: Yes; ComponentLink1Description: Datasheet; ComponentLink1URL: https://wmsc.lcsc.com/wmsc/upload/file/pdf/v2/lcsc/2201121530_CCTC-TCC0805X7R221K500DTS_C2932185.pdf; ComponentLink2Description: JLCPCB Part URL; ComponentLink2URL: https://jlcpcb.com/partdetail/C2932185; ComponentLink3Description: LCSC Part URL; ComponentLink3URL: https://lcsc.com/product-detail/Multilayer-Ceramic-Capacitors-MLCC---SMD-SMT_CCTC-CCTC-TCC0805X7R221K500DTS_C2932185.html
footprint CAP-0805 (0805 (2012M) Capacitor)
pins: 1, 2

## TCC0805X7R221K501DTS
designator C?  Capacitance: 220pF  (hidden comment: *)
Capacitor, Ceramic (MLCC), 220pF, ±10%, 500V, X7R, ±10%, SMD 0805; Manufacturer: CCTC; Manufacturer Part Number: TCC0805X7R221K501DTS; Package Size: 0805; JLCPCB Basic Part: No; JLCPCB Part Number: C880651; Supplier 1: LCSC; Category: Capacitors - MLCC; Supplier Part Number 1: C880651; Tolerance: ±10%; Voltage Rating: 500V; Temperature Coefficient: X7R; RoHS: Yes; ComponentLink1Description: Datasheet; ComponentLink1URL: https://wmsc.lcsc.com/wmsc/upload/file/pdf/v2/lcsc/2304140030_CCTC-TCC0805X7R221K501DTS_C880651.pdf; ComponentLink2Description: JLCPCB Part URL; ComponentLink2URL: https://jlcpcb.com/partdetail/C880651; ComponentLink3Description: LCSC Part URL; ComponentLink3URL: https://lcsc.com/product-detail/Multilayer-Ceramic-Capacitors-MLCC---SMD-SMT_CCTC-CCTC-TCC0805X7R221K501DTS_C880651.html
footprint CAP-0805 (0805 (2012M) Capacitor)
pins: 1, 2

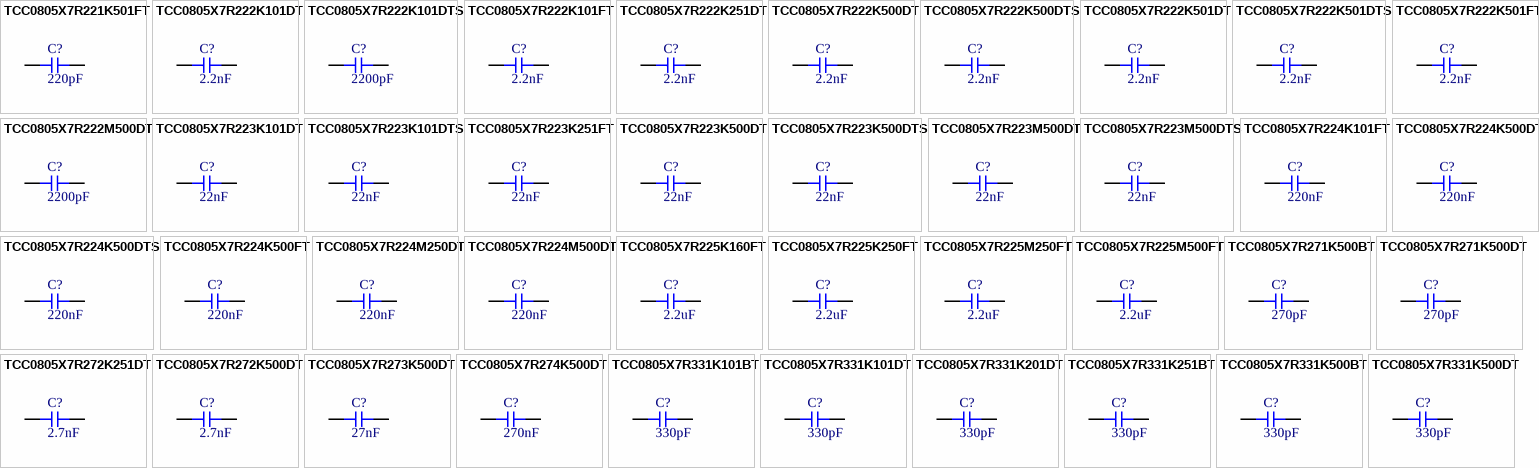
[diagram p78: symbols TCC0805X7R221K501FT to TCC0805X7R331K500DT]

## TCC0805X7R221K501FT
designator C?  Capacitance: 220pF  (hidden comment: *)
Capacitor, Ceramic (MLCC), 220pF, ±10%, 500V, X7R, ±10%, SMD 0805; Manufacturer: CCTC; Manufacturer Part Number: TCC0805X7R221K501FT; Package Size: 0805; JLCPCB Basic Part: No; JLCPCB Part Number: C376948; Supplier 1: LCSC; Category: Capacitors - MLCC; Supplier Part Number 1: C376948; Tolerance: ±10%; Voltage Rating: 500V; Temperature Coefficient: X7R; RoHS: Yes; ComponentLink1Description: Datasheet; ComponentLink1URL: https://wmsc.lcsc.com/wmsc/upload/file/pdf/v2/lcsc/2304140030_CCTC-TCC0805X7R221K501FT_C376948.pdf; ComponentLink2Description: JLCPCB Part URL; ComponentLink2URL: https://jlcpcb.com/partdetail/C376948; ComponentLink3Description: LCSC Part URL; ComponentLink3URL: https://lcsc.com/product-detail/Multilayer-Ceramic-Capacitors-MLCC---SMD-SMT_CCTC-CCTC-TCC0805X7R221K501FT_C376948.html
footprint CAP-0805 (0805 (2012M) Capacitor)
pins: 1, 2

## TCC0805X7R222K101DT
designator C?  Capacitance: 2.2nF  (hidden comment: *)
Capacitor, Ceramic (MLCC), 2.2nF, ±10%, 100V, X7R, ±10%, SMD 0805; Manufacturer: CCTC; Manufacturer Part Number: TCC0805X7R222K101DT; Package Size: 0805; JLCPCB Basic Part: No; JLCPCB Part Number: C376949; Supplier 1: LCSC; Category: Capacitors - MLCC; Supplier Part Number 1: C376949; Tolerance: ±10%; Voltage Rating: 100V; Temperature Coefficient: X7R; RoHS: Yes; ComponentLink1Description: Datasheet; ComponentLink1URL: https://wmsc.lcsc.com/wmsc/upload/file/pdf/v2/lcsc/2304140030_CCTC-TCC0805X7R222K101DT_C376949.pdf; ComponentLink2Description: JLCPCB Part URL; ComponentLink2URL: https://jlcpcb.com/partdetail/C376949; ComponentLink3Description: LCSC Part URL; ComponentLink3URL: https://lcsc.com/product-detail/Multilayer-Ceramic-Capacitors-MLCC---SMD-SMT_CCTC-CCTC-TCC0805X7R222K101DT_C376949.html
footprint CAP-0805 (0805 (2012M) Capacitor)
pins: 1, 2

## TCC0805X7R222K101DTS
designator C?  Capacitance: 2200pF  (hidden comment: *)
Capacitor, Ceramic (MLCC), 2200pF, ±10%, 100V, X7R, ±10%, SMD 0805; Manufacturer: CCTC; Manufacturer Part Number: TCC0805X7R222K101DTS; Package Size: 0805; JLCPCB Basic Part: No; JLCPCB Part Number: C880660; Supplier 1: LCSC; Category: Capacitors - MLCC; Supplier Part Number 1: C880660; Tolerance: ±10%; Voltage Rating: 100V; Temperature Coefficient: X7R; RoHS: Yes; ComponentLink1Description: Datasheet; ComponentLink1URL: https://wmsc.lcsc.com/wmsc/upload/file/pdf/v2/lcsc/2304140030_CCTC-TCC0805X7R222K101DTS_C880660.pdf; ComponentLink2Description: JLCPCB Part URL; ComponentLink2URL: https://jlcpcb.com/partdetail/C880660; ComponentLink3Description: LCSC Part URL; ComponentLink3URL: https://lcsc.com/product-detail/Multilayer-Ceramic-Capacitors-MLCC---SMD-SMT_CCTC-CCTC-TCC0805X7R222K101DTS_C880660.html
footprint CAP-0805 (0805 (2012M) Capacitor)
pins: 1, 2

## TCC0805X7R222K101FT
designator C?  Capacitance: 2.2nF  (hidden comment: *)
Capacitor, Ceramic (MLCC), 2.2nF, ±10%, 100V, X7R, ±10%, SMD 0805; Manufacturer: CCTC; Manufacturer Part Number: TCC0805X7R222K101FT; Package Size: 0805; JLCPCB Basic Part: No; JLCPCB Part Number: C376950; Supplier 1: LCSC; Category: Capacitors - MLCC; Supplier Part Number 1: C376950; Tolerance: ±10%; Voltage Rating: 100V; Temperature Coefficient: X7R; RoHS: Yes; ComponentLink1Description: Datasheet; ComponentLink1URL: https://wmsc.lcsc.com/wmsc/upload/file/pdf/v2/lcsc/2304140030_CCTC-TCC0805X7R222K101FT_C376950.pdf; ComponentLink2Description: JLCPCB Part URL; ComponentLink2URL: https://jlcpcb.com/partdetail/C376950; ComponentLink3Description: LCSC Part URL; ComponentLink3URL: https://lcsc.com/product-detail/Multilayer-Ceramic-Capacitors-MLCC---SMD-SMT_CCTC-CCTC-TCC0805X7R222K101FT_C376950.html
footprint CAP-0805 (0805 (2012M) Capacitor)
pins: 1, 2

## TCC0805X7R222K251DT
designator C?  Capacitance: 2.2nF  (hidden comment: *)
Capacitor, Ceramic (MLCC), 2.2nF, ±10%, 250V, X7R, ±10%, SMD 0805; Manufacturer: CCTC; Manufacturer Part Number: TCC0805X7R222K251DT; Package Size: 0805; JLCPCB Basic Part: No; JLCPCB Part Number: C376951; Supplier 1: LCSC; Category: Capacitors - MLCC; Supplier Part Number 1: C376951; Tolerance: ±10%; Voltage Rating: 250V; Temperature Coefficient: X7R; RoHS: Yes; ComponentLink1Description: Datasheet; ComponentLink1URL: https://wmsc.lcsc.com/wmsc/upload/file/pdf/v2/lcsc/2304140030_CCTC-TCC0805X7R222K251DT_C376951.pdf; ComponentLink2Description: JLCPCB Part URL; ComponentLink2URL: https://jlcpcb.com/partdetail/C376951; ComponentLink3Description: LCSC Part URL; ComponentLink3URL: https://lcsc.com/product-detail/Multilayer-Ceramic-Capacitors-MLCC---SMD-SMT_CCTC-CCTC-TCC0805X7R222K251DT_C376951.html
footprint CAP-0805 (0805 (2012M) Capacitor)
pins: 1, 2